# Altium footprint library laihi.PcbLib: 222 footprints (part 2 of 14)
Each footprint in its own frame and in the unit in brackets; x right, y up, seen from the top. Pads: shape width x height; smd on the part's side, far side on the other; paste and mask are expansions set on the pad; w line width, h text height; cw(c..) or ccw(c..) is an arc to the next point about the centre after c.
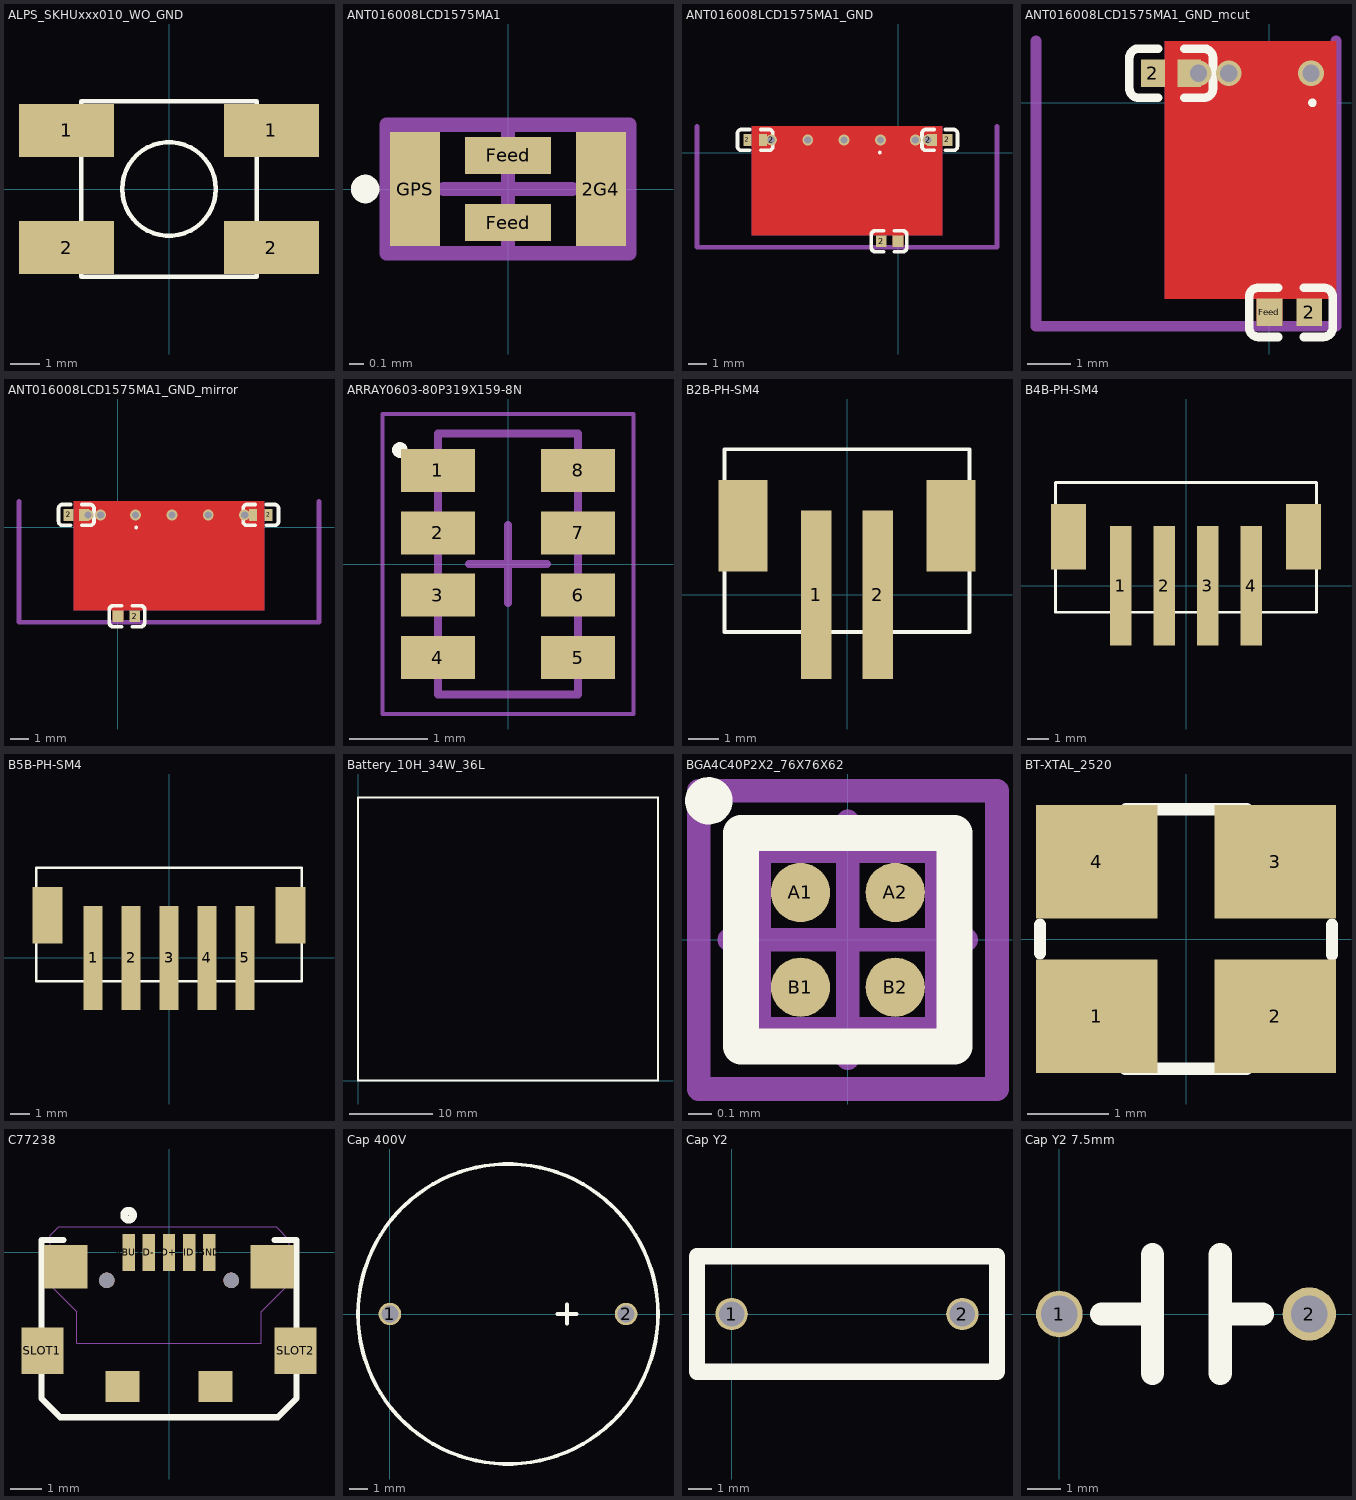
[diagram p1: the footprints below, top view; thin cyan lines are the x and y axes]

## ALPS_SKHUxxx010_WO_GND [mm]
pads (4):
  rect 3.25x1.8 smd: 1(-3.5,2) 1(3.5,2) 2(-3.5,-2) 2(3.5,-2)
Top Overlay:
  circle w0.152: c0,0 r1.601
  lines w0.152: -3,-3 -3,3 3,3 3,-3 -3,-3
3D body "Switch tact 6x6mm.stp": height 3.1, standoff 0, extent -4,-3 4,3.3

## ANT016008LCD1575MA1 [mm] "TDK Multilayer Antenna GPS and 2.4G~2.484G"
height 0.4
pads (4):
  rect 0.35x0.8 smd mask+0.04: 2G4(0.65,0) GPS(-0.65,0)
  rect 0.6x0.26 smd mask+0.04: Feed(0,-0.235) Feed(0,0.235)
Top Overlay:
  circle w0.1: c-1,0 r0.05
Mechanical 13:
  rectangle: -0.85,-0.45 -0.621,0.45
  lines w0.1: -0.85,-0.45 0.85,-0.45 0.85,0.45 -0.85,0.45 -0.85,-0.45
Mechanical 15:
  lines w0.1: -0.45,0 0.45,0 ; 0,-0.45 0,0.45

## ANT016008LCD1575MA1_GND [mm] "双频天线"
pads (8):
  rect 0.45x0.65 smd mask+0.051: 2(-8.285,0.69) ""(-7.435,0.69)
  round 0.6 hole 0.4: 2(-6.97,0.69) 2(1.65,0.69)
  rect 0.6x0.65 smd mask+0.051: 2(-0.925,-4.88)
  rect 0.55x0.65 smd mask+0.051: 2(2.715,0.69) ""(1.865,0.69)
  rect 0.6x0.65 smd: Feed(0,-4.88)
via 0.95,0.69 diameter 0.6 hole 0.4
via -0.97,0.69 diameter 0.6 hole 0.4
via -2.97,0.69 diameter 0.6 hole 0.4
via -4.97,0.69 diameter 0.6 hole 0.4
Top Layer:
  rectangle: 0.45,0.19 2.14,1.19
  rectangle: -7.66,0.19 -0.45,1.19
  rectangle: -0.3,-5.205 0.3,-0.105
  rectangle: -0.3,0.105 0.3,0.364
  region: -0.45,0.19 -0.9,0.19 -0.9,-0.38 -0.45,-0.38
  rectangle: 0.45,-0.38 0.9,0.19
  pour cut-out: -8.06,1.44 2.44,1.44 2.44,-4.56 -8.06,-4.56
Bottom Layer:
  rectangle: -7.81,0.19 -0.45,1.19
  rectangle: 0.45,0.19 2.24,1.19
  pour cut-out: -8.06,1.44 2.44,1.44 2.44,-4.56 -8.06,-4.56
Top Overlay:
  circle w0.1: c-1,0 r0.05
  lines w0.2: -8.615,0.115 cw(c-8.615,0.335) -8.835,0.335 -8.835,1.045 cw(c-8.615,1.045) -8.615,1.265 ; -8.61,0.115 -8.16,0.115 ; -8.61,1.265 -8.16,1.265 ; -7.56,0.115 -7.11,0.115 ; -7.56,1.265 -7.11,1.265 ; -7.105,0.115 ccw(c-7.105,0.335) -6.885,0.335 -6.885,1.045 ccw(c-7.105,1.045) -7.105,1.265 ; -1.255,-5.455 cw(c-1.255,-5.235) -1.475,-5.235 -1.475,-4.525 cw(c-1.255,-4.525) -1.255,-4.305 ; -1.25,-5.455 -0.8,-5.455 ; -1.25,-4.305 -0.8,-4.305 ; -0.2,-5.455 0.25,-5.455 ; -0.2,-4.305 0.25,-4.305 ; 0.255,-5.455 ccw(c0.255,-5.235) 0.475,-5.235 0.475,-4.525 ccw(c0.255,-4.525) 0.255,-4.305 ; 1.535,0.115 cw(c1.535,0.335) 1.315,0.335 1.315,1.045 cw(c1.535,1.045) 1.535,1.265 ; 1.54,0.115 1.99,0.115 ; 1.54,1.265 1.99,1.265 ; 2.59,0.115 3.04,0.115 ; 2.59,1.265 3.04,1.265 ; 3.045,0.115 ccw(c3.045,0.335) 3.265,0.335 3.265,1.045 ccw(c3.045,1.045) 3.045,1.265
Top Paste:
  region: 0.715,0.3 0.55,0.3 0.55,-0.3 0.715,-0.3
  rectangle: -0.715,-0.3 -0.55,0.3
  rectangle: -0.2,-0.3 0.2,-0.15
  rectangle: -0.2,0.15 0.2,0.3
Top Solder:
  rectangle: -1.1,-5.205 0.1,-4.555
  rectangle: -0.765,-0.364 0.765,0.364
  rectangle: -8.46,0.365 -7.26,1.015
  rectangle: 1.69,0.365 2.89,1.015
Mechanical 1:
  lines w0.254: -11.06,1.44 -11.06,-5.205 5.44,-5.205 5.44,1.44
Mechanical 13:
  rectangle: -0.85,-0.45 -0.621,0.45
  lines w0.1: -0.85,-0.45 -0.85,0.45 0.85,0.45 0.85,-0.45 -0.85,-0.45
Mechanical 15:
  lines w0.1: -0.45,0 0.45,0 ; 0,-0.45 0,0.45
3D body "0402 SMD Capacitor.step": height 0.2, standoff 0, extent -0.983,-5.18 0.018,-4.58
3D body "0402 SMD Capacitor.step": height 0.2, standoff 0, extent -8.343,0.39 -7.342,0.99
3D body "0402 SMD Capacitor.step": height 0.2, standoff 0, extent 1.807,0.39 2.808,0.99

## ANT016008LCD1575MA1_GND_mcut [mm] "双频天线"
pads (4):
  rect 0.55x0.65 smd mask+0.051: 2(-2.715,0.69) ""(-1.865,0.69)
  rect 0.6x0.65 smd mask+0.051: 2(0.925,-4.88)
  rect 0.6x0.65 smd: Feed(0,-4.88)
via -0.95,0.69 diameter 0.6 hole 0.4
via 0.97,0.69 diameter 0.6 hole 0.4
via -1.65,0.69 diameter 0.6 hole 0.4
Top Layer:
  region: -0.45,1.19 -2.14,1.19 -2.14,0.19 -0.45,0.19
  region: 1.55,1.19 0.45,1.19 0.45,0.19 1.55,0.19
  region: 0.3,-0.105 -0.3,-0.105 -0.3,-5.205 0.3,-5.205
  region: 0.3,0.364 -0.3,0.364 -0.3,0.105 0.3,0.105
  rectangle: 0.45,-0.38 0.9,0.19
  region: -0.45,0.19 -0.9,0.19 -0.9,-0.38 -0.45,-0.38
  pour cut-out: 1.55,1.44 -2.44,1.44 -2.44,-4.56 1.55,-4.56
Bottom Layer:
  region: 1.55,1.19 0.45,1.19 0.45,0.19 1.55,0.19
  region: -0.45,1.19 -2.24,1.19 -2.24,0.19 -0.45,0.19
  pour cut-out: 1.55,1.44 -2.44,1.44 -2.44,-4.56 1.55,-4.56
Top Overlay:
  circle w0.1: c1,0 r0.05
  lines w0.2: -3.045,0.115 cw(c-3.045,0.335) -3.265,0.335 -3.265,1.045 cw(c-3.045,1.045) -3.045,1.265 ; -3.04,0.115 -2.59,0.115 ; -3.04,1.265 -2.59,1.265 ; -1.99,0.115 -1.54,0.115 ; -1.99,1.265 -1.54,1.265 ; -1.535,0.115 ccw(c-1.535,0.335) -1.315,0.335 -1.315,1.045 ccw(c-1.535,1.045) -1.535,1.265 ; -0.255,-5.455 cw(c-0.255,-5.235) -0.475,-5.235 -0.475,-4.525 cw(c-0.255,-4.525) -0.255,-4.305 ; -0.25,-5.455 0.2,-5.455 ; -0.25,-4.305 0.2,-4.305 ; 0.8,-5.455 1.25,-5.455 ; 0.8,-4.305 1.25,-4.305 ; 1.255,-5.455 ccw(c1.255,-5.235) 1.475,-5.235 1.475,-4.525 ccw(c1.255,-4.525) 1.255,-4.305
Top Paste:
  rectangle: -0.715,-0.3 -0.55,0.3
  region: 0.715,0.3 0.55,0.3 0.55,-0.3 0.715,-0.3
  region: 0.2,-0.15 -0.2,-0.15 -0.2,-0.3 0.2,-0.3
  region: 0.2,0.3 -0.2,0.3 -0.2,0.15 0.2,0.15
Top Solder:
  region: 1.1,-4.555 -0.1,-4.555 -0.1,-5.205 1.1,-5.205
  region: 0.765,0.364 -0.765,0.364 -0.765,-0.364 0.765,-0.364
  region: -1.69,1.015 -2.89,1.015 -2.89,0.365 -1.69,0.365
Mechanical 1:
  lines w0.254: -5.44,1.44 -5.44,-5.205 1.55,-5.205 1.55,1.44
Mechanical 13:
  region: 0.85,0.45 0.621,0.45 0.621,-0.45 0.85,-0.45
  lines w0.1: -0.85,-0.45 -0.85,0.45 0.85,0.45 0.85,-0.45 -0.85,-0.45
Mechanical 15:
  lines w0.1: -0.45,0 0.45,0 ; 0,-0.45 0,0.45
3D body "0402 SMD Capacitor.step": height 0, standoff -0.2, extent -0.017,-5.18 0.983,-4.58
3D body "0402 SMD Capacitor.step": height 0, standoff -0.2, extent -2.807,0.39 -1.807,0.99

## ANT016008LCD1575MA1_GND_mirror [mm] "双频天线"
pads (6):
  rect 0.55x0.65 smd mask+0.051: 2(-2.715,0.69) ""(-1.865,0.69)
  rect 0.6x0.65 smd mask+0.051: 2(0.925,-4.88)
  rect 0.45x0.65 smd mask+0.051: 2(8.285,0.69) ""(7.435,0.69)
  rect 0.6x0.65 smd: Feed(0,-4.88)
via -0.95,0.69 diameter 0.6 hole 0.4
via 0.97,0.69 diameter 0.6 hole 0.4
via 2.97,0.69 diameter 0.6 hole 0.4
via 4.97,0.69 diameter 0.6 hole 0.4
via -1.65,0.69 diameter 0.6 hole 0.4
via 6.97,0.69 diameter 0.6 hole 0.4
Top Layer:
  region: -0.45,1.19 -2.14,1.19 -2.14,0.19 -0.45,0.19
  region: 7.66,1.19 0.45,1.19 0.45,0.19 7.66,0.19
  region: 0.3,-0.105 -0.3,-0.105 -0.3,-5.205 0.3,-5.205
  region: 0.3,0.364 -0.3,0.364 -0.3,0.105 0.3,0.105
  rectangle: 0.45,-0.38 0.9,0.19
  region: -0.45,0.19 -0.9,0.19 -0.9,-0.38 -0.45,-0.38
  pour cut-out: 8.06,1.44 -2.44,1.44 -2.44,-4.56 8.06,-4.56
Bottom Layer:
  region: 7.81,1.19 0.45,1.19 0.45,0.19 7.81,0.19
  region: -0.45,1.19 -2.24,1.19 -2.24,0.19 -0.45,0.19
  pour cut-out: 8.06,1.44 -2.44,1.44 -2.44,-4.56 8.06,-4.56
Top Overlay:
  circle w0.1: c1,0 r0.05
  lines w0.2: -3.045,0.115 cw(c-3.045,0.335) -3.265,0.335 -3.265,1.045 cw(c-3.045,1.045) -3.045,1.265 ; -3.04,0.115 -2.59,0.115 ; -3.04,1.265 -2.59,1.265 ; -1.99,0.115 -1.54,0.115 ; -1.99,1.265 -1.54,1.265 ; -1.535,0.115 ccw(c-1.535,0.335) -1.315,0.335 -1.315,1.045 ccw(c-1.535,1.045) -1.535,1.265 ; -0.255,-5.455 cw(c-0.255,-5.235) -0.475,-5.235 -0.475,-4.525 cw(c-0.255,-4.525) -0.255,-4.305 ; -0.25,-5.455 0.2,-5.455 ; -0.25,-4.305 0.2,-4.305 ; 0.8,-5.455 1.25,-5.455 ; 0.8,-4.305 1.25,-4.305 ; 1.255,-5.455 ccw(c1.255,-5.235) 1.475,-5.235 1.475,-4.525 ccw(c1.255,-4.525) 1.255,-4.305 ; 7.105,0.115 cw(c7.105,0.335) 6.885,0.335 6.885,1.045 cw(c7.105,1.045) 7.105,1.265 ; 7.11,0.115 7.56,0.115 ; 7.11,1.265 7.56,1.265 ; 8.16,0.115 8.61,0.115 ; 8.16,1.265 8.61,1.265 ; 8.615,0.115 ccw(c8.615,0.335) 8.835,0.335 8.835,1.045 ccw(c8.615,1.045) 8.615,1.265
Top Paste:
  rectangle: -0.715,-0.3 -0.55,0.3
  region: 0.715,0.3 0.55,0.3 0.55,-0.3 0.715,-0.3
  region: 0.2,-0.15 -0.2,-0.15 -0.2,-0.3 0.2,-0.3
  region: 0.2,0.3 -0.2,0.3 -0.2,0.15 0.2,0.15
Top Solder:
  region: 1.1,-4.555 -0.1,-4.555 -0.1,-5.205 1.1,-5.205
  region: 0.765,0.364 -0.765,0.364 -0.765,-0.364 0.765,-0.364
  region: 8.46,1.015 7.26,1.015 7.26,0.365 8.46,0.365
  region: -1.69,1.015 -2.89,1.015 -2.89,0.365 -1.69,0.365
Mechanical 1:
  lines w0.254: -5.44,1.44 -5.44,-5.205 11.06,-5.205 11.06,1.44
Mechanical 13:
  region: 0.85,0.45 0.621,0.45 0.621,-0.45 0.85,-0.45
  lines w0.1: -0.85,-0.45 -0.85,0.45 0.85,0.45 0.85,-0.45 -0.85,-0.45
Mechanical 15:
  lines w0.1: -0.45,0 0.45,0 ; 0,-0.45 0,0.45
3D body "0402 SMD Capacitor.step": height 0, standoff -0.2, extent -0.017,-5.18 0.983,-4.58
3D body "0402 SMD Capacitor.step": height 0, standoff -0.2, extent 7.343,0.39 8.343,0.99
3D body "0402 SMD Capacitor.step": height 0, standoff -0.2, extent -2.807,0.39 -1.807,0.99

## ARRAY0603-80P319X159-8N [mm] "Chip Array, Flat, 8-Leads, Pitch 0.80mm,  Body 3.20x1.60mm,  IPC Medium Density"
height 1
pads (8):
  rect 0.95x0.55 smd mask+0.076: 1(-0.9,1.2) 2(-0.9,0.4) 3(-0.9,-0.4) 4(-0.9,-1.2) 5(0.9,-1.2) 6(0.9,-0.4) 7(0.9,0.4) 8(0.9,1.2)
Top Overlay:
  circle w0.1: c-1.387,1.463 r0.05
Mechanical 13:
  lines w0.1: -0.9,-1.675 0.9,-1.675 0.9,1.675 -0.9,1.675 -0.9,-1.675
Mechanical 15:
  lines w0.05: -1.61,-1.925 1.61,-1.925 1.61,1.925 -1.61,1.925 -1.61,-1.925
  lines w0.1: -0.5,0 0.5,0 ; 0,-0.5 0,0.5
3D body "ARRAY0603-80P319X159-8N.step": height 1, standoff 0, extent -0.95,-1.675 0.95,1.675

## B2B-PH-SM4 [mm] "SMT 2PIN connector male 2.00mm pitch"
height 6.6
pads (4):
  rect 1x5.5 smd: 1(-1,0) 2(1,0)
  rect 1.6x3 smd: ""(-3.4,2.25) ""(3.4,2.25)
Top Overlay:
  lines w0.125: -4,-1.219 4,-1.219 4,4.75 -4,4.75 -4,-1.219
3D body: height 6.6, standoff 0, extent -4,-0.25 4,4.75

## B4B-PH-SM4 [mm] "SMT 4PIN connector male 2.00mm pitch"
height 6.6
pads (6):
  rect 1x5.5 smd: 1(-3,0) 2(-1,0) 3(1,0) 4(3,0)
  rect 1.6x3 smd: ""(-5.4,2.25) ""(5.4,2.25)
Top Overlay:
  lines w0.125: -6,-1.219 6,-1.219 6,4.75 -6,4.75 -6,-1.219
3D body: height 6.6, standoff 0, extent -6,-0.25 6,4.75

## B5B-PH-SM4 [mm] "SMT 5PIN connector male 2.00mm pitch"
height 6.6
pads (7):
  rect 1x5.5 smd: 1(-4,0) 2(-2,0) 3(0,0) 4(2,0) 5(4,0)
  rect 1.6x3 smd: ""(-6.4,2.25) ""(6.4,2.25)
Top Overlay:
  lines w0.125: -7,-1.219 -7,4.75 7,4.75 7,-1.219 -7,-1.219
3D body: height 6.6, standoff 0, extent -6.975,-0.25 6.975,4.75

## Battery_10H_34W_36L [mm] "Battery_10H_34W_36L"
height 10
Top Overlay:
  lines w0.254: 36,0 36,34 ; 36,0 36,0 ; 36,0 0,0 0,34 36,34 ; 36,34 36,34
3D body: height 11.5, standoff 1, extent 0,0 36,34

## BGA4C40P2X2_76X76X62 [mm]
pads (4):
  round 0.25 smd: A1(-0.2,0.2) A2(0.2,0.2) B1(-0.2,-0.2) B2(0.2,-0.2)
Top Overlay:
  circle w0.1: c-0.587,0.587 r0.05
  lines w0.152: -0.451,-0.451 -0.451,0.451 0.451,0.451 0.451,-0.451 -0.451,-0.451
Mechanical 13:
  lines w0.1: -0.375,-0.375 0.375,-0.375 0.375,0.375 -0.375,0.375 -0.375,-0.375
Mechanical 15:
  lines w0.1: -0.5,0 0.5,0 ; 0,-0.5 0,0.5 ; -0.63,-0.63 0.63,-0.63 0.63,0.63 -0.63,0.63 -0.63,-0.63
3D body: height 0.63, standoff 0.12, extent -0.375,-0.375 0.375,0.375

## BT-XTAL_2520 [mm]
pads (4):
  rect 1.5x1.4 smd: 1(-1.1,-0.95) 2(1.1,-0.95) 3(1.1,0.95) 4(-1.1,0.95)
Top Overlay:
  lines w0.152: -1.8,-0.175 -1.8,0.175 ; -0.75,-1.6 0.75,-1.6 ; -0.74,1.6 0.75,1.6 ; 1.8,-0.195 1.8,0.175
3D body "User Library-GeyerElectronics_KX6.step": height 0.56, standoff 0, extent -1.25,-1 1.27,1
3D body: height 0.56, standoff 0.15, extent -1.05,-0.8 1.05,0.8

## C77238 [mm] "microUSB立创  全贴有柱无导位 平口外焊_PDF_C77238"
height 6.7
pads (13):
  rect 0.4x1.2 smd: D+(0,0) D-(-0.65,0) GND(1.3,0) ID(0.65,0) VBUS(-1.3,0)
  rect 1.35x1.5 smd: SLOT1(-4.075,-3.16) SLOT2(4.075,-3.16)
  rect 1.4x1.4 smd: ""(-3.325,-0.46) ""(3.325,-0.46)
  round 0.5 hole 0.5 paste+0 mask+0: ""(-2,-0.9) ""(2,-0.9)
  rect 1.1x1 smd: ""(-1.5,-4.31) ""(1.5,-4.31)
Top Overlay:
  circle w0.25: c-1.3,1.2 r0.141
  lines w0.2: -3.4,0.4 -4.1,0.4 -4.1,-1.1 -4.1,-4.7 -3.5,-5.3 3.5,-5.3 4.1,-4.7 4.1,-1.1 4.1,0.4 3.4,0.4
Mechanical 15:
  lines w0.025: 3.825,-1.05 2.975,-1.9 ; 2.975,-1.9 3.875,-1 3.875,0.4 3.45,0.825 -3.55,0.825 -3.825,0.55 -3.825,-1.05 -2.975,-1.9 -2.975,-2.675 -2.975,-2.925 2.975,-2.925 2.975,-1.9
3D body: height 2.35, standoff 0, extent -4.055,-5.1 3.97,0

## Cap 400V [mm]
pads (2):
  round 1.2 hole 0.92: 1(0,0) 2(12.6,0)
Top Overlay:
  circle w0.2: c6.3,0 r8.002
  lines w0.2: 8.942,0 9.958,0 ; 9.45,-0.508 9.45,0.508

## Cap Y2 [mm] "CAP 13mm x 5mm Y2 CAP 275V"
height 11
pads (2):
  round 1.4 hole 1.1: 1(0,0) 2(10,0)
Top Overlay:
  lines w0.7: -1.5,-2.5 11.5,-2.5 11.5,2.5 -1.5,2.5 -1.5,-2.5

## Cap Y2 7.5mm [mm] "CAP Y2 CAP 275V"
height 11
pads (2):
  round 1.4 hole 1.1: 1(0,0)
  round 1.6 hole 1.1: 2(7.5,0)
Top Overlay:
  lines w0.7: 1.27,0 2.54,0 ; 2.794,-1.778 2.794,-1.27 2.794,1.778 ; 4.826,-1.778 4.826,1.778 4.826,0 ; 5.08,0 6.096,0